# Altium footprint library PHOENIX THD.PcbLib: 109 footprints (part 7 of 8)
Each footprint in its own frame and in the unit in brackets; x right, y up, seen from the top. Pads: shape width x height; smd on the part's side, far side on the other; paste and mask are expansions set on the pad; w line width, h text height; cw(c..) or ccw(c..) is an arc to the next point about the centre after c.
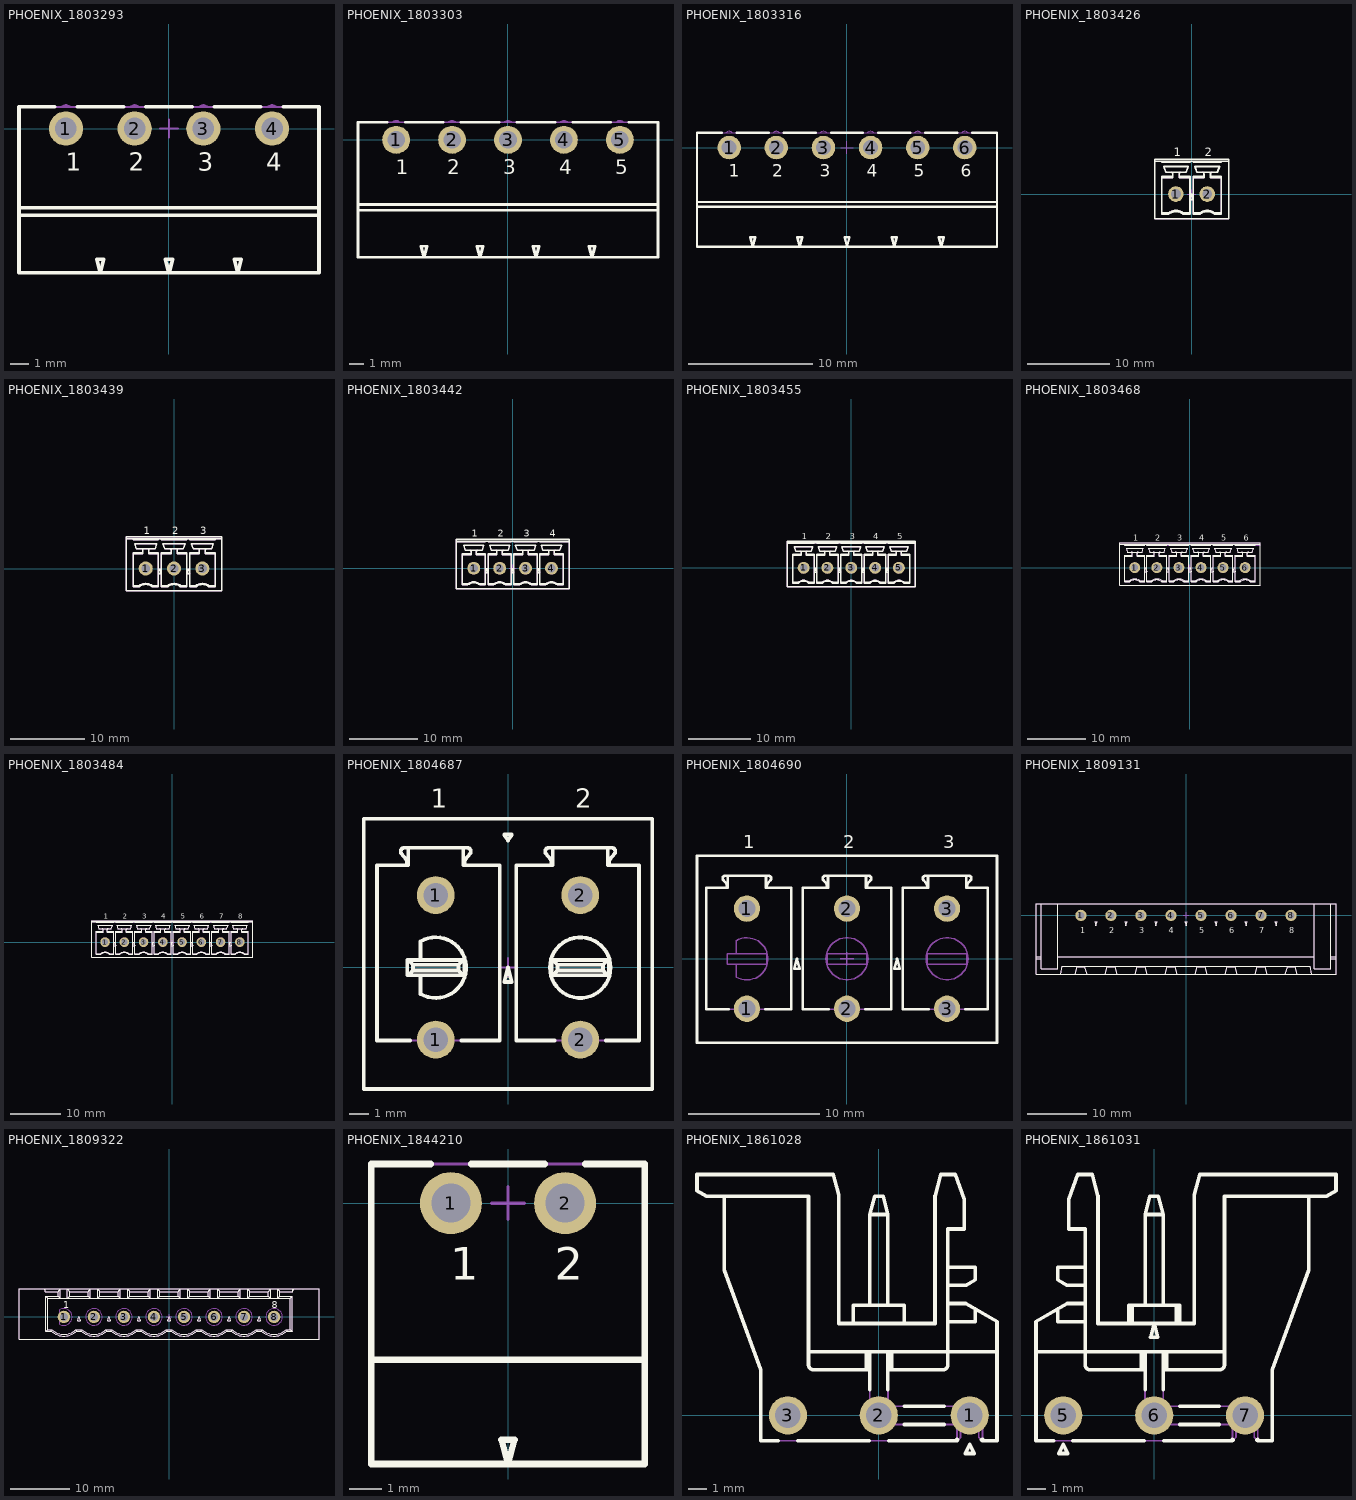
[diagram p6: the footprints below, top view; thin cyan lines are the x and y axes]

## PHOENIX_1803293 [mm] "PHOENIX MC Serie, Pitch 3.81mm, 8A, 160V, 4 Positions Right Angled Header"
height 7.25
pads (4):
  round 1.9 hole 1.2: 1(-5.715,0) 2(-1.905,0) 3(1.905,0) 4(5.715,0)
Top Overlay:
  lines w0.2: -8.315,-4.8 8.315,-4.8 ; -8.315,-4.4 8.315,-4.4 ; -6.333,1.2 -8.315,1.2 -8.315,-8 8.315,-8 8.315,1.2 6.334,1.2 ; -5.096,1.2 -2.523,1.2 ; -1.286,1.2 1.287,1.2 ; 2.524,1.2 5.097,1.2 ; -4.011,-7.25 -3.81,-8 -3.609,-7.25 -4.011,-7.25 ; -0.201,-7.25 0.201,-7.25 0,-8 -0.201,-7.25 ; 3.609,-7.25 3.81,-8 4.01,-7.25 3.609,-7.25
  text "4" at 5.399,-2.35 h1
  text "3" at 1.589,-2.35 h1
  text "2" at -2.221,-2.35 h1
  text "1" at -5.731,-2.35 h1
Mechanical 8:
  lines w0.1: -6.215,0 -5.715,0 ; -5.715,-0.5 -5.715,0 ; -5.715,0.5 -5.715,0 ; -5.215,0 -5.715,0 ; -2.405,0 -1.905,0 ; -1.905,-0.5 -1.905,0 ; -1.905,0.5 -1.905,0 ; -1.405,0 -1.905,0 ; -0.5,0 0,0 ; 0,-0.5 0,0 ; 0,0.5 0,0 ; 0.5,0 0,0 ; 1.405,0 1.905,0 ; 1.905,-0.5 1.905,0 ; 1.905,0.5 1.905,0 ; 2.405,0 1.905,0 ; 5.215,0 5.715,0 ; 5.715,-0.5 5.715,0 ; 5.715,0.5 5.715,0 ; 6.215,0 5.715,0
Mechanical 14:
  lines w0.1: -8.315,-4.8 8.315,-4.8 ; -8.315,-4.4 8.315,-4.4 ; -5.98,1.2 cw(c-5.715,0.9) -5.45,1.2 ; -2.17,1.2 cw(c-1.905,0.9) -1.64,1.2 ; 1.64,1.2 cw(c1.905,0.9) 2.17,1.2 ; 5.45,1.2 cw(c5.715,0.9) 5.98,1.2 ; -8.315,-8 8.315,-8 8.315,1.2 -8.315,1.2 -8.315,-8 ; -4.011,-7.25 -3.81,-8 -3.609,-7.25 -4.011,-7.25 ; -0.201,-7.25 0.201,-7.25 0,-8 -0.201,-7.25 ; 3.609,-7.25 3.81,-8 4.01,-7.25 3.609,-7.25
3D body "PHOENIX_1803293.stp": height 7.25, standoff -3.4, extent -8.315,-8 8.315,1.3

## PHOENIX_1803303 [mm] "PHOENIX MC Serie, Pitch 3.81mm, 8A, 160V, 5 Positions Right Angled Header"
height 7.25
pads (5):
  round 1.9 hole 1.2: 1(-7.62,0) 2(-3.81,0) 3(0,0) 4(3.81,0) 5(7.62,0)
Top Overlay:
  lines w0.2: -10.22,-4.8 10.22,-4.8 ; -10.22,-4.4 10.22,-4.4 ; -8.238,1.2 -10.22,1.2 -10.22,-8 10.22,-8 10.22,1.2 8.239,1.2 ; -7.001,1.2 -4.428,1.2 ; -3.191,1.2 -0.618,1.2 ; 0.619,1.2 3.192,1.2 ; 4.429,1.2 7.002,1.2 ; -5.916,-7.25 -5.514,-7.25 -5.715,-8 -5.916,-7.25 ; -2.106,-7.25 -1.704,-7.25 -1.905,-8 -2.106,-7.25 ; 1.704,-7.25 2.106,-7.25 1.905,-8 1.704,-7.25 ; 5.514,-7.25 5.916,-7.25 5.715,-8 5.514,-7.25
  text "5" at 7.304,-2.35 h1
  text "4" at 3.494,-2.35 h1
  text "3" at -0.316,-2.35 h1
  text "2" at -4.126,-2.35 h1
  text "1" at -7.636,-2.35 h1
Mechanical 8:
  lines w0.1: -7.62,0 -7.62,0.5 -7.62,0 ; -7.62,0 -7.12,0 -7.62,0 ; -7.62,0 -7.62,-0.5 -7.62,0 ; -7.62,0 -8.12,0 -7.62,0 ; -3.81,0 -3.81,0.5 -3.81,0 ; -3.81,0 -3.31,0 -3.81,0 ; -3.81,0 -3.81,-0.5 -3.81,0 ; -3.81,0 -4.31,0 -3.81,0 ; 0,0 0,0.5 0,0 ; 0,0 0.5,0 0,0 ; 0,0 0,-0.5 0,0 ; 0,0 -0.5,0 0,0 ; 3.81,0 3.81,0.5 3.81,0 ; 3.81,0 4.31,0 3.81,0 ; 3.81,0 3.81,-0.5 3.81,0 ; 3.81,0 3.31,0 3.81,0 ; 7.62,0 7.62,0.5 7.62,0 ; 7.62,0 8.12,0 7.62,0 ; 7.62,0 7.62,-0.5 7.62,0 ; 7.62,0 7.12,0 7.62,0
Mechanical 14:
  lines w0.1: -10.22,-4.8 10.22,-4.8 ; -10.22,-4.4 10.22,-4.4 ; -7.885,1.2 cw(c-7.62,0.9) -7.355,1.2 ; -4.075,1.2 cw(c-3.81,0.9) -3.545,1.2 ; -0.265,1.2 cw(c0,0.9) 0.265,1.2 ; 3.545,1.2 cw(c3.81,0.9) 4.075,1.2 ; 7.355,1.2 cw(c7.62,0.9) 7.885,1.2 ; -10.22,-8 -10.22,1.2 10.22,1.2 10.22,-8 -10.22,-8 ; -5.916,-7.25 -5.514,-7.25 -5.715,-8 -5.916,-7.25 ; -2.106,-7.25 -1.704,-7.25 -1.905,-8 -2.106,-7.25 ; 1.704,-7.25 2.106,-7.25 1.905,-8 1.704,-7.25 ; 5.514,-7.25 5.916,-7.25 5.715,-8 5.514,-7.25
3D body "PHOENIX_1803303.stp": height 7.25, standoff -3.4, extent -10.22,-8 10.22,1.3

## PHOENIX_1803316 [mm] "PHOENIX MC Serie, Pitch 3.81mm, 8A, 160V, 6 Positions Right Angled Header"
height 7.25
pads (6):
  round 1.9 hole 1.2: 1(-9.525,0) 2(-5.715,0) 3(-1.905,0) 4(1.905,0) 5(5.715,0) 6(9.525,0)
Top Overlay:
  lines w0.2: -12.125,-4.8 12.125,-4.8 ; -12.125,-4.4 12.125,-4.4 ; -10.143,1.2 -12.125,1.2 -12.125,-8 12.125,-8 12.125,1.2 10.143,1.2 ; -8.907,1.2 -6.333,1.2 ; -5.097,1.2 -2.523,1.2 ; -1.287,1.2 1.287,1.2 ; 2.523,1.2 5.097,1.2 ; 6.333,1.2 8.907,1.2 ; -7.82,-7.25 -7.419,-7.25 -7.62,-8 -7.82,-7.25 ; -4.01,-7.25 -3.609,-7.25 -3.81,-8 -4.01,-7.25 ; -0.2,-7.25 0.201,-7.25 0,-8 -0.2,-7.25 ; 3.61,-7.25 4.011,-7.25 3.81,-8 3.61,-7.25 ; 7.42,-7.25 7.821,-7.25 7.62,-8 7.42,-7.25
  text "1" at -9.541,-2.35 h1
  text "2" at -6.031,-2.35 h1
  text "3" at -2.221,-2.35 h1
  text "4" at 1.589,-2.35 h1
  text "5" at 5.399,-2.35 h1
  text "6" at 9.209,-2.35 h1
Mechanical 8:
  lines w0.1: -10.025,0 -9.525,0 ; -9.525,-0.5 -9.525,0 ; -9.525,0.5 -9.525,0 ; -9.025,0 -9.525,0 ; -6.215,0 -5.715,0 ; -5.715,-0.5 -5.715,0 ; -5.715,0.5 -5.715,0 ; -5.215,0 -5.715,0 ; -2.405,0 -1.905,0 ; -1.905,-0.5 -1.905,0 ; -1.905,0.5 -1.905,0 ; -1.405,0 -1.905,0 ; -0.5,0 0,0 ; 0,-0.5 0,0 ; 0,0.5 0,0 ; 0.5,0 0,0 ; 1.405,0 1.905,0 ; 1.905,-0.5 1.905,0 ; 1.905,0.5 1.905,0 ; 2.405,0 1.905,0 ; 5.215,0 5.715,0 ; 5.715,-0.5 5.715,0 ; 5.715,0.5 5.715,0 ; 6.215,0 5.715,0 ; 9.025,0 9.525,0 ; 9.525,-0.5 9.525,0 ; 9.525,0.5 9.525,0 ; 10.025,0 9.525,0
Mechanical 14:
  lines w0.1: -12.125,-4.8 12.125,-4.8 ; -12.125,-4.4 12.125,-4.4 ; -9.79,1.2 cw(c-9.525,0.9) -9.26,1.2 ; -5.98,1.2 cw(c-5.715,0.9) -5.45,1.2 ; -2.17,1.2 cw(c-1.905,0.9) -1.64,1.2 ; 1.64,1.2 cw(c1.905,0.9) 2.17,1.2 ; 5.45,1.2 cw(c5.715,0.9) 5.98,1.2 ; 9.26,1.2 cw(c9.525,0.9) 9.79,1.2 ; -12.125,-8 -12.125,1.2 12.125,1.2 12.125,-8 -12.125,-8 ; -7.82,-7.25 -7.419,-7.25 -7.62,-8 -7.82,-7.25 ; -4.01,-7.25 -3.609,-7.25 -3.81,-8 -4.01,-7.25 ; -0.2,-7.25 0.201,-7.25 0,-8 -0.2,-7.25 ; 3.61,-7.25 4.011,-7.25 3.81,-8 3.61,-7.25 ; 7.42,-7.25 7.821,-7.25 7.62,-8 7.42,-7.25
3D body "PHOENIX_1803316.stp": height 7.25, standoff -3.4, extent -12.125,-8 12.125,1.3

## PHOENIX_1803426 [mm] "PCB Header, 8A, 160 V, Pitch: 3.81mm, 2 Positions, MCV Serie"
height 9.2
pads (2):
  round 1.9 hole 1.2: 1(-1.905,0) 2(1.905,0)
Top Overlay:
  lines w0.2: -4.505,4 4.505,4 ; -3.61,-2.3 -2.805,-2.3 ; -3.61,2 -2.305,2 -2.305,2.47 ccw(c-2.505,2.47) -2.505,2.67 ; -3.608,3.9 -3.609,3.9 ; -3.608,4 -3.609,4 -3.609,3.9 ; -2.305,2.134 -3.61,2.134 -3.61,-2.434 -2.759,-2.434 ; -1.505,2.134 -0.2,2.134 -0.2,-2.434 -1.051,-2.434 ; -1.305,2.67 ccw(c-1.305,2.47) -1.505,2.47 -1.505,2 -0.2,2 ; -0.201,4 -0.2,4 -0.2,3.9 -0.201,3.9 -3.609,3.9 ; -0.2,-2.3 -1.005,-2.3 ; 0.2,-2.3 1.005,-2.3 ; 0.2,2 1.505,2 1.505,2.47 ccw(c1.305,2.47) 1.305,2.67 ; 0.202,3.9 0.201,3.9 ; 0.202,4 0.201,4 0.201,3.9 ; 1.505,2.134 0.2,2.134 0.2,-2.434 1.051,-2.434 ; 2.305,2.134 3.61,2.134 3.61,-2.434 2.759,-2.434 ; 2.505,2.67 ccw(c2.505,2.47) 2.305,2.47 2.305,2 3.61,2 ; 3.609,4 3.61,4 3.61,3.9 3.609,3.9 0.201,3.9 ; 3.61,-2.3 2.805,-2.3 ; -2.805,-2.3 cw(c-1.905,-3.5) -1.005,-2.3 ; -2.805,-2.3 -2.794,-2.334 -2.782,-2.367 ccw(c5.266,0.384) -2.759,-2.434 ; -2.759,-2.434 cw(c-1.905,-3.5) -1.051,-2.434 ; -1.051,-2.434 -1.039,-2.401 -1.028,-2.367 ccw(c-9.737,0.61) -1.005,-2.3 ; 1.005,-2.3 cw(c1.905,-3.5) 2.805,-2.3 ; 1.005,-2.3 1.016,-2.334 1.028,-2.367 ccw(c9.076,0.384) 1.051,-2.434 ; 1.051,-2.434 cw(c1.905,-3.5) 2.759,-2.434 ; 2.759,-2.434 2.771,-2.401 2.782,-2.367 ccw(c-5.927,0.61) 2.805,-2.3 ; -4.505,-3 4.505,-3 4.505,4.25 -4.505,4.25 -4.505,-3 ; -3.395,3.35 -0.415,3.35 -0.65,2.67 -3.16,2.67 -3.395,3.35 ; -0.188,-0.7 0.188,-0.7 0,0 -0.188,-0.7 ; 0.415,3.35 3.395,3.35 3.16,2.67 0.65,2.67 0.415,3.35
  text "1" at -2.18,4.6 h1
  text "2" at 1.63,4.6 h1
Mechanical 8:
  lines w0.1: -2.405,0 -1.905,0 ; -1.905,-0.5 -1.905,0 ; -1.905,0.5 -1.905,0 ; -1.405,0 -1.905,0 ; -0.5,0 0,0 ; 0,-0.5 0,0 ; 0,0.5 0,0 ; 0.5,0 0,0 ; 1.405,0 1.905,0 ; 1.905,-0.5 1.905,0 ; 1.905,0.5 1.905,0 ; 2.405,0 1.905,0
Mechanical 14:
  lines w0.1: -4.505,4 4.505,4 ; -3.61,-2.3 -2.805,-2.3 ; -3.61,2 -2.305,2 -2.305,2.47 ccw(c-2.505,2.47) -2.505,2.67 ; -3.608,3.9 -3.609,3.9 ; -3.608,4 -3.609,4 -3.609,3.9 ; -2.305,2.134 -3.61,2.134 -3.61,-2.434 -2.759,-2.434 ; -1.505,2.134 -0.2,2.134 -0.2,-2.434 -1.051,-2.434 ; -1.305,2.67 ccw(c-1.305,2.47) -1.505,2.47 -1.505,2 -0.2,2 ; -0.201,4 -0.2,4 -0.2,3.9 -0.201,3.9 -3.609,3.9 ; -0.2,-2.3 -1.005,-2.3 ; 0.2,-2.3 1.005,-2.3 ; 0.2,2 1.505,2 1.505,2.47 ccw(c1.305,2.47) 1.305,2.67 ; 0.202,3.9 0.201,3.9 ; 0.202,4 0.201,4 0.201,3.9 ; 1.505,2.134 0.2,2.134 0.2,-2.434 1.051,-2.434 ; 2.305,2.134 3.61,2.134 3.61,-2.434 2.759,-2.434 ; 2.505,2.67 ccw(c2.505,2.47) 2.305,2.47 2.305,2 3.61,2 ; 3.609,4 3.61,4 3.61,3.9 3.609,3.9 0.201,3.9 ; 3.61,-2.3 2.805,-2.3 ; -2.805,-2.3 cw(c-1.905,-3.5) -1.005,-2.3 ; -2.805,-2.3 -2.794,-2.334 -2.782,-2.367 ccw(c5.266,0.384) -2.759,-2.434 ; -2.759,-2.434 cw(c-1.905,-3.5) -1.051,-2.434 ; -1.051,-2.434 -1.039,-2.401 -1.028,-2.367 ccw(c-9.737,0.61) -1.005,-2.3 ; 1.005,-2.3 cw(c1.905,-3.5) 2.805,-2.3 ; 1.005,-2.3 1.016,-2.334 1.028,-2.367 ccw(c9.076,0.384) 1.051,-2.434 ; 1.051,-2.434 cw(c1.905,-3.5) 2.759,-2.434 ; 2.759,-2.434 2.771,-2.401 2.782,-2.367 ccw(c-5.927,0.61) 2.805,-2.3 ; -4.505,-3 4.505,-3 4.505,4.25 -4.505,4.25 -4.505,-3 ; -3.395,3.35 -0.415,3.35 -0.65,2.67 -3.16,2.67 -3.395,3.35 ; -2.405,-0.625 ccw(c-1.905,0) -2.405,0.625 -2.405,-0.624 ; -2.305,-0.4 -2.305,0.4 -1.505,0.4 -1.505,-0.4 -2.305,-0.4 ; -0.188,-0.7 0.188,-0.7 0,0 -0.188,-0.7 ; 0.415,3.35 3.395,3.35 3.16,2.67 0.65,2.67 0.415,3.35 ; 1.405,-0.625 ccw(c1.905,0) 1.405,0.625 1.405,-0.624 ; 1.505,-0.4 1.505,0.4 2.305,0.4 2.305,-0.4 1.505,-0.4
3D body "PHOENIX_1803426.stp": height 9.2, standoff -3.4, extent -4.505,-3 4.505,4.25

## PHOENIX_1803439 [mm] "PCB Header, 8A, 160 V, Pitch: 3.81mm, 3 Positions, MCV Serie"
height 9.2
pads (3):
  round 1.9 hole 1.2: 1(-3.81,0) 2(0,0) 3(3.81,0)
Top Overlay:
  lines w0.2: -6.41,4 6.41,4 ; -5.515,-2.3 -4.71,-2.3 ; -5.515,2 -4.21,2 -4.21,2.47 ccw(c-4.41,2.47) -4.41,2.67 ; -5.513,3.9 -5.514,3.9 ; -5.513,4 -5.514,4 -5.514,3.9 ; -4.21,2.134 -5.515,2.134 -5.515,-2.434 -4.664,-2.434 ; -3.41,2.134 -2.105,2.134 -2.105,-2.434 -2.956,-2.434 ; -3.21,2.67 ccw(c-3.21,2.47) -3.41,2.47 -3.41,2 -2.105,2 ; -2.106,4 -2.105,4 -2.105,3.9 -2.106,3.9 -5.514,3.9 ; -2.105,-2.3 -2.91,-2.3 ; -1.705,-2.3 -0.9,-2.3 ; -1.705,2 -0.4,2 -0.4,2.47 ccw(c-0.6,2.47) -0.6,2.67 ; -1.703,3.9 -1.704,3.9 ; -1.703,4 -1.704,4 -1.704,3.9 ; -0.4,2.134 -1.705,2.134 -1.705,-2.434 -0.854,-2.434 ; 0.4,2.134 1.705,2.134 1.705,-2.434 0.854,-2.434 ; 0.6,2.67 ccw(c0.6,2.47) 0.4,2.47 0.4,2 1.705,2 ; 1.704,4 1.705,4 1.705,3.9 1.704,3.9 -1.704,3.9 ; 1.705,-2.3 0.9,-2.3 ; 2.105,-2.3 2.91,-2.3 ; 2.105,2 3.41,2 3.41,2.47 ccw(c3.21,2.47) 3.21,2.67 ; 2.107,3.9 2.106,3.9 ; 2.107,4 2.106,4 2.106,3.9 ; 3.41,2.134 2.105,2.134 2.105,-2.434 2.956,-2.434 ; 4.21,2.134 5.515,2.134 5.515,-2.434 4.664,-2.434 ; 4.41,2.67 ccw(c4.41,2.47) 4.21,2.47 4.21,2 5.515,2 ; 5.514,4 5.515,4 5.515,3.9 5.514,3.9 2.106,3.9 ; 5.515,-2.3 4.71,-2.3 ; -4.71,-2.3 cw(c-3.81,-3.5) -2.91,-2.3 ; -4.71,-2.3 -4.699,-2.334 -4.687,-2.367 ccw(c3.361,0.384) -4.664,-2.434 ; -4.664,-2.434 cw(c-3.81,-3.5) -2.956,-2.434 ; -2.956,-2.434 -2.944,-2.401 -2.933,-2.367 ccw(c-11.642,0.61) -2.91,-2.3 ; -0.9,-2.3 cw(c0,-3.5) 0.9,-2.3 ; -0.9,-2.3 -0.889,-2.334 -0.877,-2.367 ccw(c7.171,0.384) -0.854,-2.434 ; -0.854,-2.434 cw(c0,-3.5) 0.854,-2.434 ; 0.854,-2.434 0.866,-2.401 0.877,-2.367 ccw(c-7.832,0.61) 0.9,-2.3 ; 2.91,-2.3 cw(c3.81,-3.5) 4.71,-2.3 ; 2.91,-2.3 2.921,-2.334 2.933,-2.367 ccw(c10.981,0.384) 2.956,-2.434 ; 2.956,-2.434 cw(c3.81,-3.5) 4.664,-2.434 ; 4.664,-2.434 4.676,-2.401 4.687,-2.367 ccw(c-4.022,0.61) 4.71,-2.3 ; -6.41,-3 6.41,-3 6.41,4.25 -6.41,4.25 -6.41,-3 ; -5.3,3.35 -2.32,3.35 -2.555,2.67 -5.065,2.67 -5.3,3.35 ; -2.093,-0.7 -1.717,-0.7 -1.905,0 -2.093,-0.7 ; -1.49,3.35 1.49,3.35 1.255,2.67 -1.255,2.67 -1.49,3.35 ; 1.717,-0.7 2.093,-0.7 1.905,0 1.717,-0.7 ; 2.32,3.35 5.3,3.35 5.065,2.67 2.555,2.67 2.32,3.35
  text "3" at 3.535,4.6 h1
  text "2" at -0.275,4.6 h1
  text "1" at -4.085,4.6 h1
Mechanical 2:
  circle w0.1: c0,0 r0.8
  circle w0.1: c3.81,0 r0.8
Mechanical 8:
  lines w0.1: -4.31,0 -3.81,0 ; -3.81,-0.5 -3.81,0 ; -3.81,0.5 -3.81,0 ; -3.31,0 -3.81,0 ; -0.5,0 0,0 ; 0,-0.5 0,0 ; 0,0.5 0,0 ; 0.5,0 0,0 ; 3.31,0 3.81,0 ; 3.81,-0.5 3.81,0 ; 3.81,0.5 3.81,0 ; 4.31,0 3.81,0
Mechanical 14:
  lines w0.1: -6.41,4 6.41,4 ; -5.515,-2.3 -4.71,-2.3 ; -5.515,2 -4.21,2 -4.21,2.47 ccw(c-4.41,2.47) -4.41,2.67 ; -5.513,3.9 -5.514,3.9 ; -5.513,4 -5.514,4 -5.514,3.9 ; -4.21,2.134 -5.515,2.134 -5.515,-2.434 -4.664,-2.434 ; -3.41,2.134 -2.105,2.134 -2.105,-2.434 -2.956,-2.434 ; -3.21,2.67 ccw(c-3.21,2.47) -3.41,2.47 -3.41,2 -2.105,2 ; -2.106,4 -2.105,4 -2.105,3.9 -2.106,3.9 -5.514,3.9 ; -2.105,-2.3 -2.91,-2.3 ; -1.705,-2.3 -0.9,-2.3 ; -1.705,2 -0.4,2 -0.4,2.47 ccw(c-0.6,2.47) -0.6,2.67 ; -1.703,3.9 -1.704,3.9 ; -1.703,4 -1.704,4 -1.704,3.9 ; -0.4,2.134 -1.705,2.134 -1.705,-2.434 -0.854,-2.434 ; 0.4,2.134 1.705,2.134 1.705,-2.434 0.854,-2.434 ; 0.6,2.67 ccw(c0.6,2.47) 0.4,2.47 0.4,2 1.705,2 ; 1.704,4 1.705,4 1.705,3.9 1.704,3.9 -1.704,3.9 ; 1.705,-2.3 0.9,-2.3 ; 2.105,-2.3 2.91,-2.3 ; 2.105,2 3.41,2 3.41,2.47 ccw(c3.21,2.47) 3.21,2.67 ; 2.107,3.9 2.106,3.9 ; 2.107,4 2.106,4 2.106,3.9 ; 3.41,2.134 2.105,2.134 2.105,-2.434 2.956,-2.434 ; 4.21,2.134 5.515,2.134 5.515,-2.434 4.664,-2.434 ; 4.41,2.67 ccw(c4.41,2.47) 4.21,2.47 4.21,2 5.515,2 ; 5.514,4 5.515,4 5.515,3.9 5.514,3.9 2.106,3.9 ; 5.515,-2.3 4.71,-2.3 ; -4.71,-2.3 cw(c-3.81,-3.5) -2.91,-2.3 ; -4.71,-2.3 -4.699,-2.334 -4.687,-2.367 ccw(c3.361,0.384) -4.664,-2.434 ; -4.664,-2.434 cw(c-3.81,-3.5) -2.956,-2.434 ; -2.956,-2.434 -2.944,-2.401 -2.933,-2.367 ccw(c-11.642,0.61) -2.91,-2.3 ; -0.9,-2.3 cw(c0,-3.5) 0.9,-2.3 ; -0.9,-2.3 -0.889,-2.334 -0.877,-2.367 ccw(c7.171,0.384) -0.854,-2.434 ; -0.854,-2.434 cw(c0,-3.5) 0.854,-2.434 ; 0.854,-2.434 0.866,-2.401 0.877,-2.367 ccw(c-7.832,0.61) 0.9,-2.3 ; 2.91,-2.3 cw(c3.81,-3.5) 4.71,-2.3 ; 2.91,-2.3 2.921,-2.334 2.933,-2.367 ccw(c10.981,0.384) 2.956,-2.434 ; 2.956,-2.434 cw(c3.81,-3.5) 4.664,-2.434 ; 4.664,-2.434 4.676,-2.401 4.687,-2.367 ccw(c-4.022,0.61) 4.71,-2.3 ; -6.41,-3 6.41,-3 6.41,4.25 -6.41,4.25 -6.41,-3 ; -5.3,3.35 -2.32,3.35 -2.555,2.67 -5.065,2.67 -5.3,3.35 ; -4.31,-0.625 ccw(c-3.81,0) -4.31,0.625 -4.31,-0.624 ; -4.21,-0.4 -4.21,0.4 -3.41,0.4 -3.41,-0.4 -4.21,-0.4 ; -2.093,-0.7 -1.717,-0.7 -1.905,0 -2.093,-0.7 ; -1.49,3.35 1.49,3.35 1.255,2.67 -1.255,2.67 -1.49,3.35 ; -0.4,-0.4 -0.4,0.4 0.4,0.4 0.4,-0.4 -0.4,-0.4 ; 1.717,-0.7 2.093,-0.7 1.905,0 1.717,-0.7 ; 2.32,3.35 5.3,3.35 5.065,2.67 2.555,2.67 2.32,3.35 ; 3.41,-0.4 3.41,0.4 4.21,0.4 4.21,-0.4 3.41,-0.4
3D body "PHOENIX_1803439.stp": height 9.2, standoff -3.4, extent -6.41,-3 6.41,4.25

## PHOENIX_1803442 [mm] "PCB Header, 8A, 160 V, Pitch: 3.81mm, 4 Positions, MCV Serie"
height 9.2
pads (4):
  round 1.9 hole 1.2: 1(-5.715,0) 2(-1.905,0) 3(1.905,0) 4(5.715,0)
Top Overlay:
  lines w0.2: -8.315,3.9 -4.011,3.9 -4.01,3.9 -4.01,4 -4.011,4 ; -8.315,4 8.315,4 ; -7.42,-2.3 -6.615,-2.3 ; -7.42,2 -6.115,2 -6.115,2.47 ccw(c-6.315,2.47) -6.315,2.67 ; -6.115,2.134 -7.42,2.134 -7.42,-2.434 -6.569,-2.434 ; -5.315,2.134 -4.01,2.134 -4.01,-2.434 -4.861,-2.434 ; -5.115,2.67 ccw(c-5.115,2.47) -5.315,2.47 -5.315,2 -4.01,2 ; -4.01,-2.3 -4.815,-2.3 ; -3.61,-2.3 -2.805,-2.3 ; -3.61,2 -2.305,2 -2.305,2.47 ccw(c-2.505,2.47) -2.505,2.67 ; -3.609,4 -3.61,4 -3.61,3.9 -3.609,3.9 -0.201,3.9 -0.2,3.9 -0.2,4 -0.201,4 ; -2.305,2.134 -3.61,2.134 -3.61,-2.434 -2.759,-2.434 ; -1.505,2.134 -0.2,2.134 -0.2,-2.434 -1.051,-2.434 ; -1.305,2.67 ccw(c-1.305,2.47) -1.505,2.47 -1.505,2 -0.2,2 ; -0.2,-2.3 -1.005,-2.3 ; 0.2,-2.3 1.005,-2.3 ; 0.2,2 1.505,2 1.505,2.47 ccw(c1.305,2.47) 1.305,2.67 ; 0.201,4 0.2,4 0.2,3.9 0.201,3.9 3.609,3.9 3.61,3.9 3.61,4 3.609,4 ; 1.505,2.134 0.2,2.134 0.2,-2.434 1.051,-2.434 ; 2.305,2.134 3.61,2.134 3.61,-2.434 2.759,-2.434 ; 2.505,2.67 ccw(c2.505,2.47) 2.305,2.47 2.305,2 3.61,2 ; 3.61,-2.3 2.805,-2.3 ; 4.01,-2.3 4.815,-2.3 ; 4.01,2 5.315,2 5.315,2.47 ccw(c5.115,2.47) 5.115,2.67 ; 4.011,4 4.01,4 4.01,3.9 4.011,3.9 8.315,3.9 ; 5.315,2.134 4.01,2.134 4.01,-2.434 4.861,-2.434 ; 6.115,2.134 7.42,2.134 7.42,-2.434 6.569,-2.434 ; 6.315,2.67 ccw(c6.315,2.47) 6.115,2.47 6.115,2 7.42,2 ; 7.42,-2.3 6.615,-2.3 ; -6.615,-2.3 cw(c-5.715,-3.5) -4.815,-2.3 ; -6.615,-2.3 -6.604,-2.334 -6.592,-2.367 ccw(c1.456,0.384) -6.569,-2.434 ; -6.569,-2.434 cw(c-5.715,-3.5) -4.861,-2.434 ; -4.861,-2.434 -4.849,-2.401 -4.838,-2.367 ccw(c-13.547,0.61) -4.815,-2.3 ; -2.805,-2.3 cw(c-1.905,-3.5) -1.005,-2.3 ; -2.805,-2.3 -2.794,-2.334 -2.782,-2.367 ccw(c5.266,0.384) -2.759,-2.434 ; -2.759,-2.434 cw(c-1.905,-3.5) -1.051,-2.434 ; -1.051,-2.434 -1.039,-2.401 -1.028,-2.367 ccw(c-9.737,0.61) -1.005,-2.3 ; 1.005,-2.3 cw(c1.905,-3.5) 2.805,-2.3 ; 1.005,-2.3 1.016,-2.334 1.028,-2.367 ccw(c9.05,0.375) 1.051,-2.434 ; 1.051,-2.434 cw(c1.905,-3.5) 2.759,-2.434 ; 2.759,-2.434 2.771,-2.401 2.782,-2.367 ccw(c-5.968,0.624) 2.805,-2.3 ; 4.815,-2.3 cw(c5.715,-3.5) 6.615,-2.3 ; 4.815,-2.3 4.826,-2.334 4.838,-2.367 ccw(c12.886,0.384) 4.861,-2.434 ; 4.861,-2.434 cw(c5.715,-3.5) 6.569,-2.434 ; 6.569,-2.434 6.581,-2.401 6.592,-2.367 ccw(c-2.117,0.61) 6.615,-2.3 ; -8.315,-3 8.315,-3 8.315,4.25 -8.315,4.25 -8.315,-3 ; -7.205,3.35 -4.225,3.35 -4.46,2.67 -6.97,2.67 -7.205,3.35 ; -3.998,-0.7 -3.622,-0.7 -3.81,0 -3.998,-0.7 ; -3.395,3.35 -0.415,3.35 -0.65,2.67 -3.16,2.67 -3.395,3.35 ; -0.188,-0.7 0.188,-0.7 0,0 -0.188,-0.7 ; 0.415,3.35 3.395,3.35 3.16,2.67 0.65,2.67 0.415,3.35 ; 3.622,-0.7 3.998,-0.7 3.81,0 3.622,-0.7 ; 4.225,3.35 4.46,2.67 6.97,2.67 7.205,3.35 4.225,3.35
  text "1" at -5.99,4.6 h1
  text "2" at -2.18,4.6 h1
  text "3" at 1.63,4.6 h1
  text "4" at 5.44,4.6 h1
Mechanical 8:
  lines w0.1: -6.215,0 -5.715,0 ; -5.715,-0.5 -5.715,0 ; -5.715,0.5 -5.715,0 ; -5.215,0 -5.715,0 ; -2.405,0 -1.905,0 ; -1.905,-0.5 -1.905,0 ; -1.905,0.5 -1.905,0 ; -1.405,0 -1.905,0 ; -0.5,0 0,0 ; 0,-0.5 0,0 ; 0,0.5 0,0 ; 0.5,0 0,0 ; 1.405,0 1.905,0 ; 1.905,-0.5 1.905,0 ; 1.905,0.5 1.905,0 ; 2.405,0 1.905,0 ; 5.215,0 5.715,0 ; 5.715,-0.5 5.715,0 ; 5.715,0.5 5.715,0 ; 6.215,0 5.715,0